# Altium footprint library 电阻封装库.PcbLib: 218 footprints (part 3 of 14)
Each footprint in its own frame and in the unit in brackets; x right, y up, seen from the top. Pads: shape width x height; smd on the part's side, far side on the other; paste and mask are expansions set on the pad; w line width, h text height; cw(c..) or ccw(c..) is an arc to the next point about the centre after c.
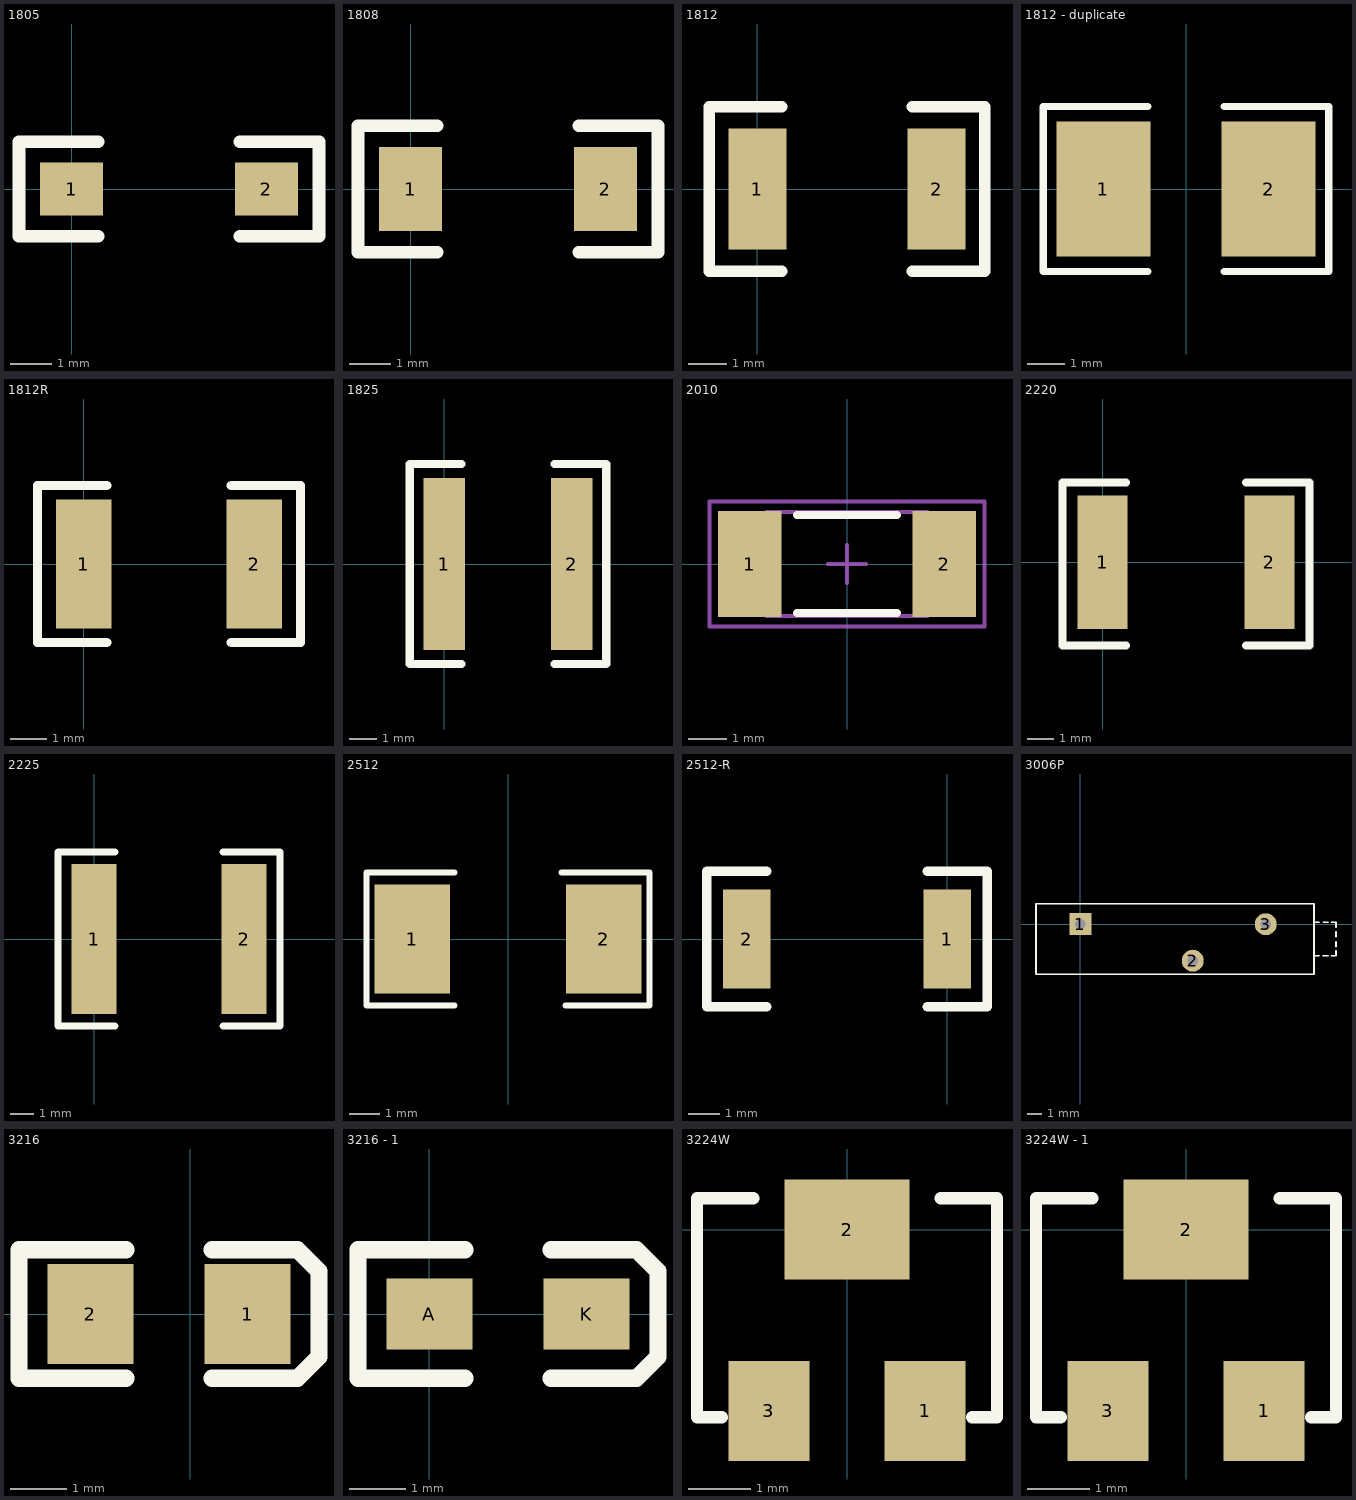
[diagram p2: the footprints below, top view; thin cyan lines are the x and y axes]

## 1805 [mil]
pads (2):
  rect 60x50 smd: 1(0,0) 2(185,0)
Top Overlay:
  lines w12: 25,-45 -50,-45 -50,45 25,45 ; 160,-45 235,-45 235,45 160,45

## 1808 [mil]
pads (2):
  rect 60x80 smd: 1(0,0) 2(185,0)
Top Overlay:
  lines w12: 25,-60 -50,-60 -50,60 25,60 ; 160,-60 235,-60 235,60 160,60

## 1812 [mil]
pads (2):
  rect 60x125 smd: 1(0,0) 2(185,0)
Top Overlay:
  lines w12: 25,-85 -50,-85 -50,85 25,85 ; 160,-85 235,-85 235,85 160,85

## 1812 - duplicate [mm] "保险丝"
height 1
pads (2):
  rect 2.5x3.6 smd: 1(-2.2,0) 2(2.2,0)
Top Overlay:
  lines w0.2: -1.016,-2.2 -3.81,-2.2 -3.81,2.2 -1.016,2.2 ; 1.016,-2.2 3.81,-2.2 3.81,2.2 1.016,2.2
3D body: height 0.9, standoff 0, extent -2.54,0.635 -2.032,1.524
3D body: height 0.9, standoff 0, extent -2.54,-1.524 -2.032,-0.635
3D body: height 0.9, standoff 0, extent 2.159,-1.524 2.667,-0.635
3D body: height 0.9, standoff 0, extent 2.159,0.635 2.667,1.524
3D body: height 1.2, standoff 0, extent -2.286,-1.651 2.286,1.651

## 1812R [mil]
pads (2):
  rect 60x140 smd: 1(0,0) 2(185,0)
Top Overlay:
  lines w10: 25,-85 -50,-85 -50,85 25,85 ; 160,-85 235,-85 235,85 160,85
3D body "SW3dPS-1812 SMD Resistor.STEP": height 63.07, standoff 0, extent 3.42,-62 180.58,63.98

## 1825 [mil]
pads (2):
  rect 60x250 smd: 1(0,0) 2(185,0)
Top Overlay:
  lines w12: 25,-145 -50,-145 -50,145 25,145 ; 160,-145 235,-145 235,145 160,145

## 2010 [mm] "贴片电阻"
height 0.6
pads (2):
  rect 1.65x2.75 smd: 1(-2.525,0) 2(2.525,0)
Top Overlay:
  lines w0.2: -1.3,-1.275 1.3,-1.275 ; -1.3,1.275 1.3,1.275
Mechanical 13:
  lines w0.1: -2.1,-1.35 2.1,-1.35 2.1,1.35 -2.1,1.35 -2.1,-1.35
Mechanical 15:
  lines w0.1: -0.5,0 0.5,0 ; 0,-0.5 0,0.5 ; -3.575,-1.625 3.575,-1.625 3.575,1.625 -3.575,1.625 -3.575,-1.625
3D body: height 0.6, standoff 0, extent -2.1,-1.35 2.1,1.35

## 2220 [mm]
pads (2):
  rect 1.905x5.08 smd: 1(0,0) 2(6.35,0)
Top Overlay:
  lines w0.305: 0.889,-3.175 -1.524,-3.175 -1.524,3.048 0.889,3.048 ; 5.461,-3.175 7.874,-3.175 7.874,3.048 5.461,3.048

## 2225 [mm]
pads (2):
  rect 1.905x6.35 smd: 1(0,0) 2(6.35,0)
Top Overlay:
  lines w0.305: 0.889,-3.683 -1.524,-3.683 -1.524,3.683 0.889,3.683 ; 5.461,-3.683 7.874,-3.683 7.874,3.683 5.461,3.683

## 2512 [mm] "保险丝"
height 1
pads (2):
  rect 2.5x3.6 smd: 1(-3.175,0) 2(3.175,0)
Top Overlay:
  lines w0.2: -1.778,-2.2 -4.699,-2.2 -4.699,2.2 -1.778,2.2 ; 1.778,2.2 4.699,2.2 4.699,-2.2 1.905,-2.2
3D body: height 1.2, standoff 0, extent -3.175,-1.651 3.175,1.651
3D body: height 0.9, standoff 0, extent 2.159,0.635 2.667,1.524
3D body: height 0.9, standoff 0, extent 2.159,-1.524 2.667,-0.635
3D body: height 0.9, standoff 0, extent -2.54,-1.524 -2.032,-0.635
3D body: height 0.9, standoff 0, extent -2.54,0.635 -2.032,1.524

## 2512-R [mil]
pads (2):
  rect 60x125 smd: 1(0,0) 2(-251.97,0)
Top Overlay:
  lines w11.81: -226.97,-85 -301.97,-85 -301.97,85 -226.97,85 ; -25,-85 50,-85 50,85 -25,85
3D body "User Library-res2512.STEP": height 25.23, standoff 0, extent -259.84,-64.96 7.87,64.96

## 3006P [mm]
pads (3):
  rect 1.5x1.5 hole 0.7: 1(0,0)
  round 1.5 hole 0.7: 2(7.7,-2.5) 3(12.7,-0.004)
Top Overlay:
  lines w0.127: 16.013,-2.159 16.343,-2.159 ; 16.013,0.127 16.343,0.127 ; 16.622,-2.159 16.953,-2.159 ; 16.648,0.127 16.978,0.127 ; 17.181,-2.159 17.511,-2.159 17.511,-1.829 ; 17.181,0.127 17.511,0.127 17.511,-0.203 ; 17.511,-1.549 17.511,-1.219 ; 17.511,-0.864 17.511,-0.533 ; -3.037,-3.429 -3.037,1.397 16.013,1.397 16.013,-3.429 -3.037,-3.429
3D body "bourns 3006p.STEP": height 7.17, standoff -4.38, extent -3.048,-3.429 17.526,1.397

## 3216 [mil]
pads (2):
  rect 60x70 smd: 1(40,0) 2(-70,0)
Top Overlay:
  lines w12: -45,-45 -120,-45 -120,45 -45,45 ; 15,-45 75,-45 90,-30 90,30 75,45 15,45

## 3216 - 1 [mil]
pads (2):
  rect 60x50 smd: A(0,0) K(110,0)
Top Overlay:
  lines w12: 25,-45 -50,-45 -50,45 25,45 ; 85,-45 145,-45 160,-30 160,30 145,45 85,45

## 3224W [mm]
pads (3):
  rect 1.3x1.6 smd: 1(1.25,-2.9) 3(-1.25,-2.9)
  rect 2x1.6 smd: 2(0,0)
Top Overlay:
  lines w0.2: -2,-3 -2.4,-3 -2.4,0.5 -1.5,0.5 ; 1.5,0.5 2.4,0.5 2.4,-3 2,-3
3D body "3224W SMT top adj cermet trimmer_4mm.STEP": height 5.29, standoff 0, extent -2.387,-3.306 2.439,0.632

## 3224W - 1 [mm]
pads (3):
  rect 1.3x1.6 smd: 1(1.25,-2.9) 3(-1.25,-2.9)
  rect 2x1.6 smd: 2(0,0)
Top Overlay:
  lines w0.2: -2,-3 -2.4,-3 -2.4,0.5 -1.5,0.5 ; 1.5,0.5 2.4,0.5 2.4,-3 2,-3